# Altium schematic symbol library IC_TI.SCHLIB: 1162 symbols (part 7 of 8) (continued)
## TMS320F2812PGFA (continued)

## TMS320F28023DAT
designator U?
Integrated Circuit; Manufacturer_Name: Texas Instruments; Manufacturer_Part_Number: TMS320F28023DAT; Datasheet Link: http://www.ti.com/lit/gpn/tms320f28023
footprint TSSOP38_0.65
pins: 1 VDD_2, 2 VSS_2, 3 ~VREGENZ, 4 VDDIO, 5 GPIO2/EPWM2A, 6 GPIO3/EPWM2B, 7 GPIO4/EPWM3A, 8 GPIO5/EPWM3B/ECAP1, 9 GPIO6/EPWM4A/EPWMSYNCI/EPWMSYNCO, 10 GPIO7/EPWM4B/SCIRXDA, 11 VDD, 12 VSS, 13 GPIO12/~TZ1/SCITXDA, 14 GPIO28/SCIRXDA/SDAA/~TZ2, 15 GPIO29/SCITXDA/SCLA/~TZ3, 16 ~TRST, 17 ~XRS, 18 ADCINA6/AIO6, 19 ADCINA4/AIO4, 20 ADCINA2/COMP1A/AIO2, 21 ADCINA0/VREFHI, 22 VDDA, 23 VSSA/VREFLO, 24 ADCINB2/COMP1B/AIO10, 25 ADCINB4/AIO12, 26 ADCINB6/AIO14, 27 GPIO34, 28 GPIO35_(TDI), 29 GPIO36_(TMS), 30 GPIO37_(TDO), 31 GPIO38/XCLKIN_(TCK), 32 GPIO18/SPICLKA/SCITXDA/XCLKOUT, 33 GPIO19/XCLKIN/~SPISTEA/SCIRXDA/ECAP1, 34 GPIO17/SPISOMIA/~TZ3, 35 GPIO16/SPISIMOA/~TZ2, 36 GPIO1/EPWM1B/COMP1OUT, 37 GPIO0/EPWM1A, 38 TEST

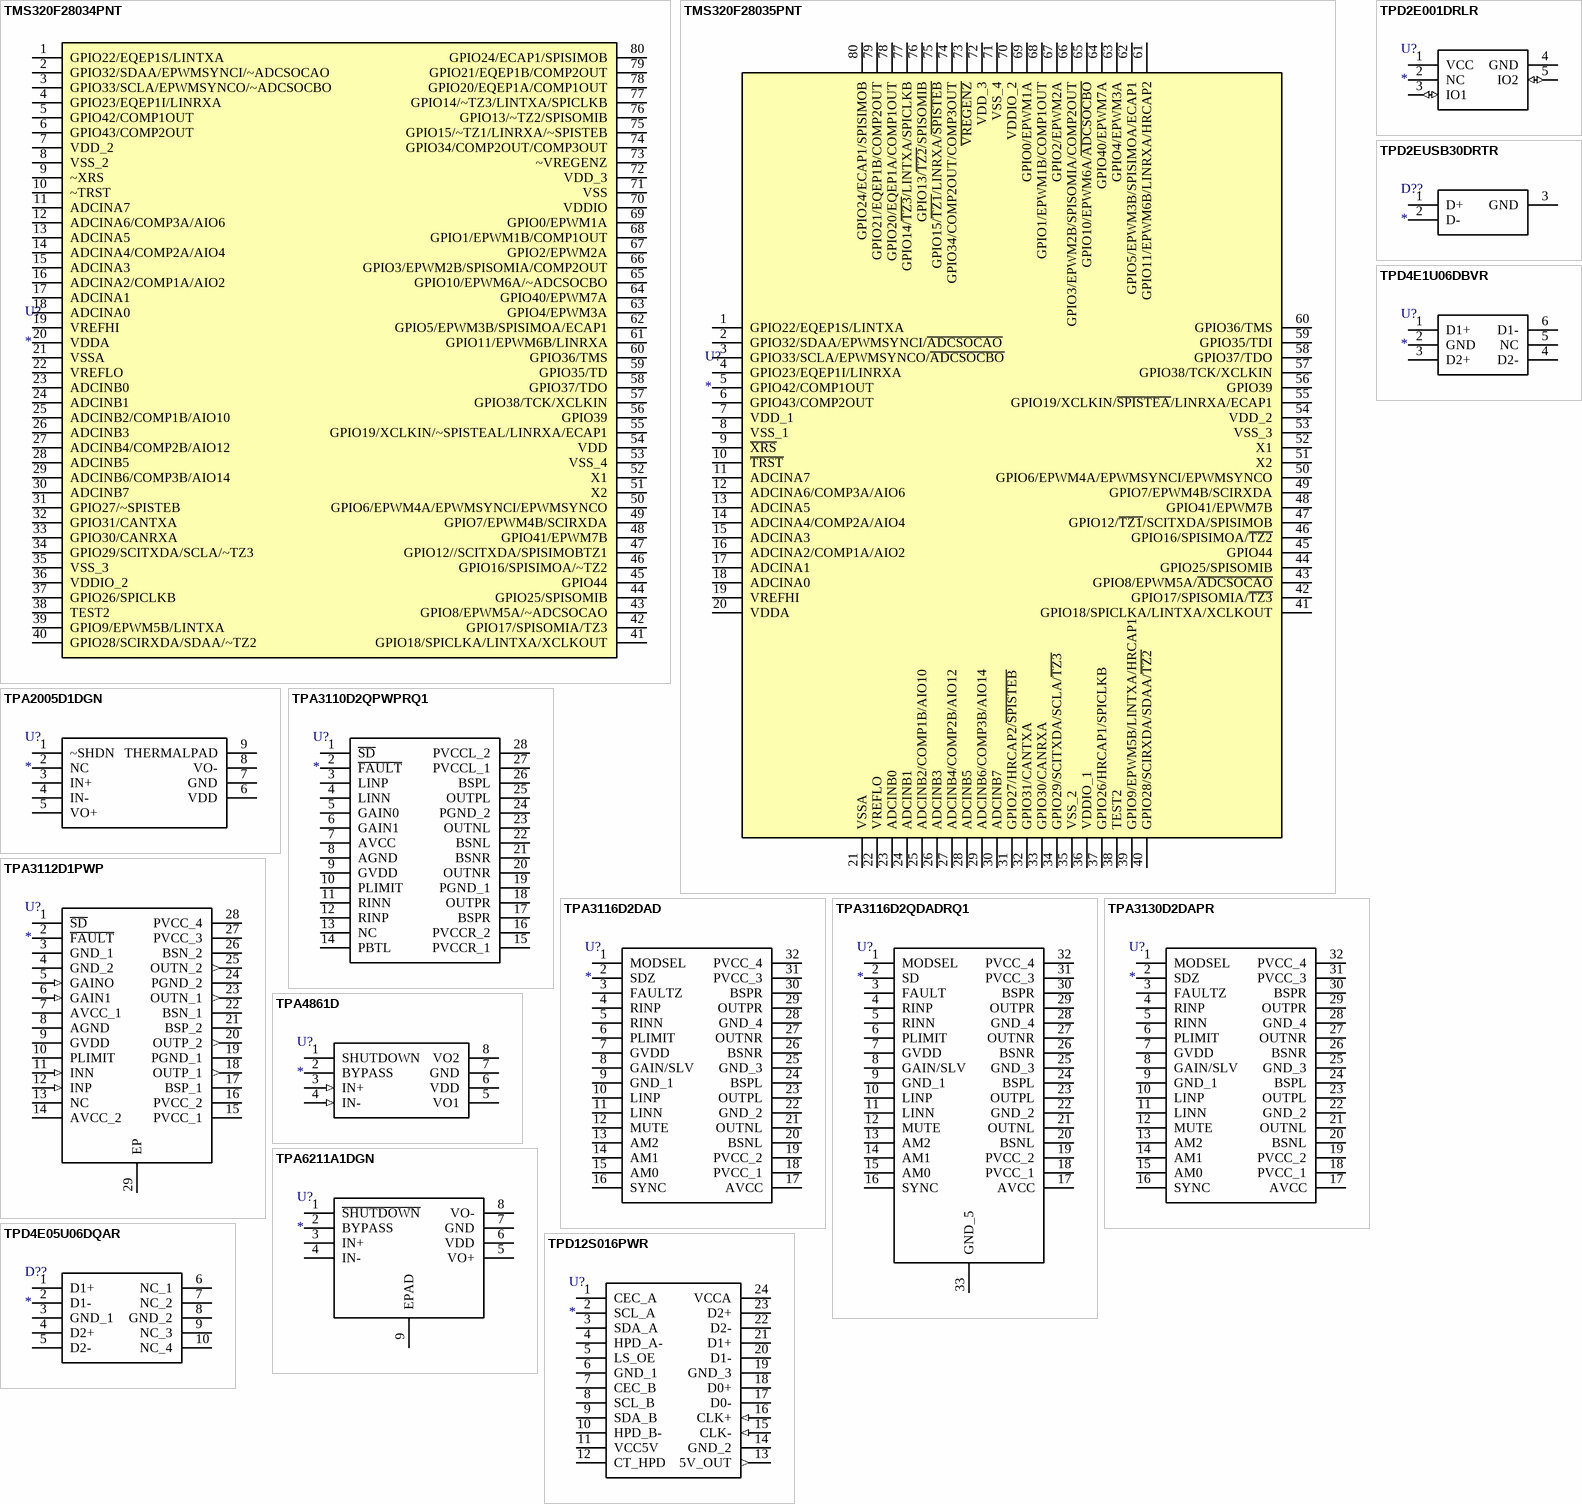
[diagram p29: symbols TMS320F28034PNT to TPD12S016PWR]

## TMS320F28034PNT
designator U?
Integrated Circuit; Manufacturer_Name: Texas Instruments; Manufacturer_Part_Number: TMS320F28034PNT; Mouser Part Number: 595-TMS320F28034PNT; Mouser Price/Stock: https://www.mouser.com/Search/Refine.aspx?Keyword=595-TMS320F28034PNT; RS Part Number: 8184844P; RS Price/Stock: http://uk.rs-online.com/web/p/products/8184844P
footprint LQFP80_0.5mm
pins: 1 GPIO22/EQEP1S/LINTXA, 2 GPIO32/SDAA/EPWMSYNCI/~ADCSOCAO, 3 GPIO33/SCLA/EPWMSYNCO/~ADCSOCBO, 4 GPIO23/EQEP1I/LINRXA, 5 GPIO42/COMP1OUT, 6 GPIO43/COMP2OUT, 7 VDD_2, 8 VSS_2, 9 ~XRS, 10 ~TRST, 11 ADCINA7, 12 ADCINA6/COMP3A/AIO6, 13 ADCINA5, 14 ADCINA4/COMP2A/AIO4, 15 ADCINA3, 16 ADCINA2/COMP1A/AIO2, 17 ADCINA1, 18 ADCINA0, 19 VREFHI, 20 VDDA, 21 VSSA, 22 VREFLO, 23 ADCINB0, 24 ADCINB1, 25 ADCINB2/COMP1B/AIO10, 26 ADCINB3, 27 ADCINB4/COMP2B/AIO12, 28 ADCINB5, 29 ADCINB6/COMP3B/AIO14, 30 ADCINB7, 31 GPIO27/~SPISTEB, 32 GPIO31/CANTXA, 33 GPIO30/CANRXA, 34 GPIO29/SCITXDA/SCLA/~TZ3, 35 VSS_3, 36 VDDIO_2, 37 GPIO26/SPICLKB, 38 TEST2, 39 GPIO9/EPWM5B/LINTXA, 40 GPIO28/SCIRXDA/SDAA/~TZ2, 41 GPIO18/SPICLKA/LINTXA/XCLKOUT, 42 GPIO17/SPISOMIA/TZ3, 43 GPIO8/EPWM5A/~ADCSOCAO, 44 GPIO25/SPISOMIB, 45 GPIO44, 46 GPIO16/SPISIMOA/~TZ2, 47 GPIO12//SCITXDA/SPISIMOBTZ1, 48 GPIO41/EPWM7B, 49 GPIO7/EPWM4B/SCIRXDA, 50 GPIO6/EPWM4A/EPWMSYNCI/EPWMSYNCO, 51 X2, 52 X1, 53 VSS_4, 54 VDD, 55 GPIO19/XCLKIN/~SPISTEAL/LINRXA/ECAP1, 56 GPIO39, 57 GPIO38/TCK/XCLKIN, 58 GPIO37/TDO, 59 GPIO35/TD, 60 GPIO36/TMS, 61 GPIO11/EPWM6B/LINRXA, 62 GPIO5/EPWM3B/SPISIMOA/ECAP1, 63 GPIO4/EPWM3A, 64 GPIO40/EPWM7A, 65 GPIO10/EPWM6A/~ADCSOCBO, 66 GPIO3/EPWM2B/SPISOMIA/COMP2OUT, 67 GPIO2/EPWM2A, 68 GPIO1/EPWM1B/COMP1OUT, 69 GPIO0/EPWM1A, 70 VDDIO, 71 VSS, 72 VDD_3, 73 ~VREGENZ, 74 GPIO34/COMP2OUT/COMP3OUT, 75 GPIO15/~TZ1/LINRXA/~SPISTEB, 76 GPIO13/~TZ2/SPISOMIB, 77 GPIO14/~TZ3/LINTXA/SPICLKB, 78 GPIO20/EQEP1A/COMP1OUT, 79 GPIO21/EQEP1B/COMP2OUT, 80 GPIO24/ECAP1/SPISIMOB

## TMS320F28035PNT
designator U?
Integrated Circuit; Manufacturer_Name: Texas Instruments; Manufacturer_Part_Number: TMS320F28035PNT; Datasheet Link: http://www.ti.com/lit/ds/symlink/tms320f28035.pdf; Height: 1.6mm; Mouser Part Number: 595-TMS320F28035PNT; Mouser Price/Stock: https://www.mouser.com/Search/Refine.aspx?Keyword=595-TMS320F28035PNT; RS Part Number: 6987013P; RS Price/Stock: http://uk.rs-online.com/web/p/products/6987013P
footprint LQFP80_0.5mm
pins: 1 GPIO22/EQEP1S/LINTXA, 2 GPIO32/SDAA/EPWMSYNCI/~{ADCSOCAO}, 3 GPIO33/SCLA/EPWMSYNCO/~{ADCSOCBO}, 4 GPIO23/EQEP1I/LINRXA, 5 GPIO42/COMP1OUT, 6 GPIO43/COMP2OUT, 7 VDD_1, 8 VSS_1, 9 ~{XRS}, 10 ~{TRST}, 11 ADCINA7, 12 ADCINA6/COMP3A/AIO6, 13 ADCINA5, 14 ADCINA4/COMP2A/AIO4, 15 ADCINA3, 16 ADCINA2/COMP1A/AIO2, 17 ADCINA1, 18 ADCINA0, 19 VREFHI, 20 VDDA, 21 VSSA, 22 VREFLO, 23 ADCINB0, 24 ADCINB1, 25 ADCINB2/COMP1B/AIO10, 26 ADCINB3, 27 ADCINB4/COMP2B/AIO12, 28 ADCINB5, 29 ADCINB6/COMP3B/AIO14, 30 ADCINB7, 31 GPIO27/HRCAP2/~{SPISTEB}, 32 GPIO31/CANTXA, 33 GPIO30/CANRXA, 34 GPIO29/SCITXDA/SCLA/~{TZ3}, 35 VSS_2, 36 VDDIO_1, 37 GPIO26/HRCAP1/SPICLKB, 38 TEST2, 39 GPIO9/EPWM5B/LINTXA/HRCAP1, 40 GPIO28/SCIRXDA/SDAA/~{TZ2}, 41 GPIO18/SPICLKA/LINTXA/XCLKOUT, 42 GPIO17/SPISOMIA/~{TZ3}, 43 GPIO8/EPWM5A/~{ADCSOCAO}, 44 GPIO25/SPISOMIB, 45 GPIO44, 46 GPIO16/SPISIMOA/~{TZ2}, 47 GPIO12/~{TZ1}/SCITXDA/SPISIMOB, 48 GPIO41/EPWM7B, 49 GPIO7/EPWM4B/SCIRXDA, 50 GPIO6/EPWM4A/EPWMSYNCI/EPWMSYNCO, 51 X2, 52 X1, 53 VSS_3, 54 VDD_2, 55 GPIO19/XCLKIN/~{SPISTEA}/LINRXA/ECAP1, 56 GPIO39, 57 GPIO38/TCK/XCLKIN, 58 GPIO37/TDO, 59 GPIO35/TDI, 60 GPIO36/TMS, 61 GPIO11/EPWM6B/LINRXA/HRCAP2, 62 GPIO5/EPWM3B/SPISIMOA/ECAP1, 63 GPIO4/EPWM3A, 64 GPIO40/EPWM7A, 65 GPIO10/EPWM6A/~{ADCSOCBO}, 66 GPIO3/EPWM2B/SPISOMIA/COMP2OUT, 67 GPIO2/EPWM2A, 68 GPIO1/EPWM1B/COMP1OUT, 69 GPIO0/EPWM1A, 70 VDDIO_2, 71 VSS_4, 72 VDD_3, 73 ~{VREGENZ}, 74 GPIO34/COMP2OUT/COMP3OUT, 75 GPIO15/~{TZ1}/LINRXA/~{SPISTEB}, 76 GPIO13/~{TZ2}/SPISOMIB, 77 GPIO14/~{TZ3}/LINTXA/SPICLKB, 78 GPIO20/EQEP1A/COMP1OUT, 79 GPIO21/EQEP1B/COMP2OUT, 80 GPIO24/ECAP1/SPISIMOB

## TPA2005D1DGN
designator U?
Integrated Circuit; Manufacturer_Name: Texas Instruments; Manufacturer_Part_Number: TPA2005D1DGN; Datasheet Link: http://www.ti.com/lit/gpn/tpa2005d1; Mouser Part Number: 595-TPA2005D1DGN; Mouser Price/Stock: https://www.mouser.com/Search/Refine.aspx?Keyword=595-TPA2005D1DGN; RS Part Number: 1625314; RS Price/Stock: http://uk.rs-online.com/web/p/products/1625314
footprint VSSOP8_0.65-PAD
pins: 1 ~SHDN, 2 NC, 3 IN+, 4 IN-, 5 VO+, 6 VDD, 7 GND, 8 VO-, 9 THERMALPAD

## TPA3110D2QPWPRQ1
designator U?
Integrated Circuit; Manufacturer_Name: Texas Instruments; Manufacturer_Part_Number: TPA3110D2QPWPRQ1; Datasheet Link: http://www.ti.com/lit/gpn/tpa3110d2-q1; Height: 1.2mm; Mouser Part Number: 595-TPA3110D2QPWPRQ1; Mouser Price/Stock: https://www.mouser.com/Search/Refine.aspx?Keyword=595-TPA3110D2QPWPRQ1
footprint TSSOP28_0.65
pins: 1 ~{SD}, 2 ~{FAULT}, 3 LINP, 4 LINN, 5 GAIN0, 6 GAIN1, 7 AVCC, 8 AGND, 9 GVDD, 10 PLIMIT, 11 RINN, 12 RINP, 13 NC, 14 PBTL, 15 PVCCR_1, 16 PVCCR_2, 17 BSPR, 18 OUTPR, 19 PGND_1, 20 OUTNR, 21 BSNR, 22 BSNL, 23 OUTNL, 24 PGND_2, 25 OUTPL, 26 BSPL, 27 PVCCL_1, 28 PVCCL_2

## TPA3112D1PWP
designator U?
Integrated Circuit; Manufacturer_Name: Texas Instruments; Manufacturer_Part_Number: TPA3112D1PWP; Datasheet Link: http://docs-emea.rs-online.com/webdocs/12f7/0900766b812f7a8f.pdf; Height: 1.2mm; Mouser Part Number: 595-TPA3112D1PWP; Mouser Price/Stock: https://www.mouser.com/Search/Refine.aspx?Keyword=595-TPA3112D1PWP; RS Part Number: 8124227P; RS Price/Stock: http://uk.rs-online.com/web/p/products/8124227P
footprint TSSOP28_0.65-PAD
pins: 1 ~{SD}, 2 ~{FAULT}, 3 GND_1 (power), 4 GND_2 (power), 5 GAINO (in), 6 GAIN1 (in), 7 AVCC_1 (power), 8 AGND (power), 9 GVDD (power), 10 PLIMIT, 11 INN (in), 12 INP (in), 13 NC, 14 AVCC_2 (power), 15 PVCC_1 (power), 16 PVCC_2 (power), 17 BSP_1, 18 OUTP_1 (out), 19 PGND_1 (power), 20 OUTP_2 (out), 21 BSP_2, 22 BSN_1, 23 OUTN_1 (out), 24 PGND_2 (power), 25 OUTN_2 (out), 26 BSN_2, 27 PVCC_3 (power), 28 PVCC_4 (power), 29 EP

## TPA3116D2DAD
designator U?
Integrated Circuit; Manufacturer_Name: Texas Instruments; Manufacturer_Part_Number: TPA3116D2DAD; Datasheet Link: http://www.ti.com/lit/ds/symlink/tpa3116d2.pdf; Height: 1.2mm; Mouser Part Number: 595-TPA3116D2DAD; Mouser Price/Stock: https://www.mouser.com/Search/Refine.aspx?Keyword=595-TPA3116D2DAD; RS Part Number: 1627861; RS Price/Stock: http://uk.rs-online.com/web/p/products/1627861
footprint TSSOP32_0.65
pins: 1 MODSEL, 2 SDZ, 3 FAULTZ, 4 RINP, 5 RINN, 6 PLIMIT, 7 GVDD, 8 GAIN/SLV, 9 GND_1, 10 LINP, 11 LINN, 12 MUTE, 13 AM2, 14 AM1, 15 AM0, 16 SYNC, 17 AVCC, 18 PVCC_1, 19 PVCC_2, 20 BSNL, 21 OUTNL, 22 GND_2, 23 OUTPL, 24 BSPL, 25 GND_3, 26 BSNR, 27 OUTNR, 28 GND_4, 29 OUTPR, 30 BSPR, 31 PVCC_3, 32 PVCC_4

## TPA3116D2QDADRQ1
designator U?
Integrated Circuit; Manufacturer_Name: Texas Instruments; Manufacturer_Part_Number: TPA3116D2QDADRQ1; Datasheet Link: http://www.ti.com/lit/gpn/tpa3116d2-q1; Height: 1.2mm; Mouser Part Number: 595-TPA3116D2QDADRQ1; Mouser Price/Stock: https://www.mouser.com/Search/Refine.aspx?Keyword=595-TPA3116D2QDADRQ1
footprint TSSOP32_0.65-PAD
pins: 1 MODSEL, 2 SD, 3 FAULT, 4 RINP, 5 RINN, 6 PLIMIT, 7 GVDD, 8 GAIN/SLV, 9 GND_1, 10 LINP, 11 LINN, 12 MUTE, 13 AM2, 14 AM1, 15 AM0, 16 SYNC, 17 AVCC, 18 PVCC_1, 19 PVCC_2, 20 BSNL, 21 OUTNL, 22 GND_2, 23 OUTPL, 24 BSPL, 25 GND_3, 26 BSNR, 27 OUTNR, 28 GND_4, 29 OUTPR, 30 BSPR, 31 PVCC_3, 32 PVCC_4, 33 GND_5

## TPA3130D2DAPR
designator U?
Integrated Circuit; Manufacturer_Name: Texas Instruments; Manufacturer_Part_Number: TPA3130D2DAPR; Datasheet Link: http://www.ti.com/lit/ds/symlink/tpa3130d2.pdf; Height: 1.2mm; Mouser Part Number: 595-TPA3130D2DAPR; Mouser Price/Stock: https://www.mouser.com/Search/Refine.aspx?Keyword=595-TPA3130D2DAPR
footprint TSSOP32_0.65
pins: 1 MODSEL, 2 SDZ, 3 FAULTZ, 4 RINP, 5 RINN, 6 PLIMIT, 7 GVDD, 8 GAIN/SLV, 9 GND_1, 10 LINP, 11 LINN, 12 MUTE, 13 AM2, 14 AM1, 15 AM0, 16 SYNC, 17 AVCC, 18 PVCC_1, 19 PVCC_2, 20 BSNL, 21 OUTNL, 22 GND_2, 23 OUTPL, 24 BSPL, 25 GND_3, 26 BSNR, 27 OUTNR, 28 GND_4, 29 OUTPR, 30 BSPR, 31 PVCC_3, 32 PVCC_4

## TPA4861D
designator U?
Integrated Circuit; Manufacturer_Name: Texas Instruments; Manufacturer_Part_Number: TPA4861D; Datasheet Link: http://www.ti.com/lit/ds/symlink/tpa4861.pdf; Height: 1.75mm; Mouser Part Number: 595-TPA4861D; Mouser Price/Stock: https://www.mouser.com/Search/Refine.aspx?Keyword=595-TPA4861D; RS Part Number: 1456524; RS Price/Stock: http://uk.rs-online.com/web/p/products/1456524
footprint SOIC8_1.27 (SOP, 8-Leads, Pitch 1.27mm)
pins: 1 SHUTDOWN, 2 BYPASS, 3 IN+ (in), 4 IN- (in), 5 VO1, 6 VDD (power), 7 GND (power), 8 VO2

## TPA6211A1DGN
designator U?
Integrated Circuit; Manufacturer_Name: Texas Instruments; Manufacturer_Part_Number: TPA6211A1DGN; Datasheet Link: http://www.ti.com/lit/gpn/tpa6211a1; Height: 1.1mm; Mouser Part Number: 595-TPA6211A1DGN; Mouser Price/Stock: https://www.mouser.com/Search/Refine.aspx?Keyword=595-TPA6211A1DGN; RS Part Number: 1625323; RS Price/Stock: http://uk.rs-online.com/web/p/products/1625323
footprint VSSOP8_0.65-PAD
pins: 1 ~{SHUTDOWN}, 2 BYPASS, 3 IN+, 4 IN-, 5 VO+, 6 VDD, 7 GND, 8 VO-, 9 EPAD

## TPD2E001DRLR
designator U?
Integrated Circuit; Manufacturer_Name: Texas Instruments; Manufacturer_Part_Number: TPD2E001DRLR; Datasheet Link: http://www.ti.com/lit/ds/symlink/tpd2e001.pdf; Height: 0.6mm; Mouser Part Number: 595-TPD2E001DRLR; Mouser Price/Stock: https://www.mouser.com/Search/Refine.aspx?Keyword=595-TPD2E001DRLR; RS Part Number: 7099050; RS Price/Stock: http://uk.rs-online.com/web/p/products/7099050
footprint SOT553
pins: 1 VCC (power), 2 NC, 3 IO1 (io), 4 GND (power), 5 IO2 (io)

## TPD2EUSB30DRTR
designator D??
Diode; Manufacturer_Name: Texas Instruments; Manufacturer_Part_Number: TPD2EUSB30DRTR; Datasheet Link: http://docs-emea.rs-online.com/webdocs/1520/0900766b81520865.pdf; Height: 0.5mm; Mouser Part Number: 595-TPD2EUSB30DRTR; Mouser Price/Stock: https://www.mouser.com/Search/Refine.aspx?Keyword=595-TPD2EUSB30DRTR; RS Part Number: 7968357P; RS Price/Stock: http://uk.rs-online.com/web/p/products/7968357P
footprint SOT723
pins: 1 D+, 2 D-, 3 GND

## TPD4E1U06DBVR
designator U?
Integrated Circuit; Manufacturer_Name: Texas Instruments; Manufacturer_Part_Number: TPD4E1U06DBVR; Datasheet Link: http://www.ti.com/lit/ds/symlink/tpd4e1u06.pdf; Height: 1.45mm; Mouser Part Number: 595-TPD4E1U06DBVR; Mouser Price/Stock: https://www.mouser.com/Search/Refine.aspx?Keyword=595-TPD4E1U06DBVR; RS Part Number: 8255334P; RS Price/Stock: http://uk.rs-online.com/web/p/products/8255334P
footprint SOT23-6
pins: 1 D1+, 2 GND (power), 3 D2+, 4 D2-, 5 NC, 6 D1-

## TPD4E05U06DQAR
designator D??
Diode; Manufacturer_Name: Texas Instruments; Manufacturer_Part_Number: TPD4E05U06DQAR; Datasheet Link: http://www.ti.com/lit/gpn/tpd4e05u06; Mouser Part Number: 595-TPD4E05U06DQAR; Mouser Price/Stock: https://www.mouser.com/Search/Refine.aspx?Keyword=595-TPD4E05U06DQAR
footprint SON10_0.5-PAD(1X2.5)
pins: 1 D1+, 2 D1-, 3 GND_1, 4 D2+, 5 D2-, 6 NC_1, 7 NC_2, 8 GND_2, 9 NC_3, 10 NC_4

## TPD12S016PWR
designator U?
Integrated Circuit; Manufacturer_Name: Texas Instruments; Manufacturer_Part_Number: TPD12S016PWR; Datasheet Link: http://www.ti.com/lit/ds/symlink/tpd12s016.pdf; Height: 1.2mm; Mouser Part Number: 595-TPD12S016PWR; Mouser Price/Stock: https://www.mouser.com/Search/Refine.aspx?Keyword=595-TPD12S016PWR; RS Part Number: 1627865; RS Price/Stock: http://uk.rs-online.com/web/p/products/1627865
footprint TSSOP24_0.65 (TSOP, 24-Leads, Body 7.80x4.40mm, Pitch 0.65mm, Thermal Pad 5.16x2.40mm, IPC Low Density)
pins: 1 CEC_A, 2 SCL_A, 3 SDA_A, 4 HPD_A-, 5 LS_OE, 6 GND_1 (power), 7 CEC_B, 8 SCL_B, 9 SDA_B, 10 HPD_B-, 11 VCC5V (power), 12 CT_HPD, 13 5V_OUT (out), 14 GND_2 (power), 15 CLK- (in), 16 CLK+ (in), 17 D0-, 18 D0+, 19 GND_3 (power), 20 D1-, 21 D1+, 22 D2-, 23 D2+, 24 VCCA (power)

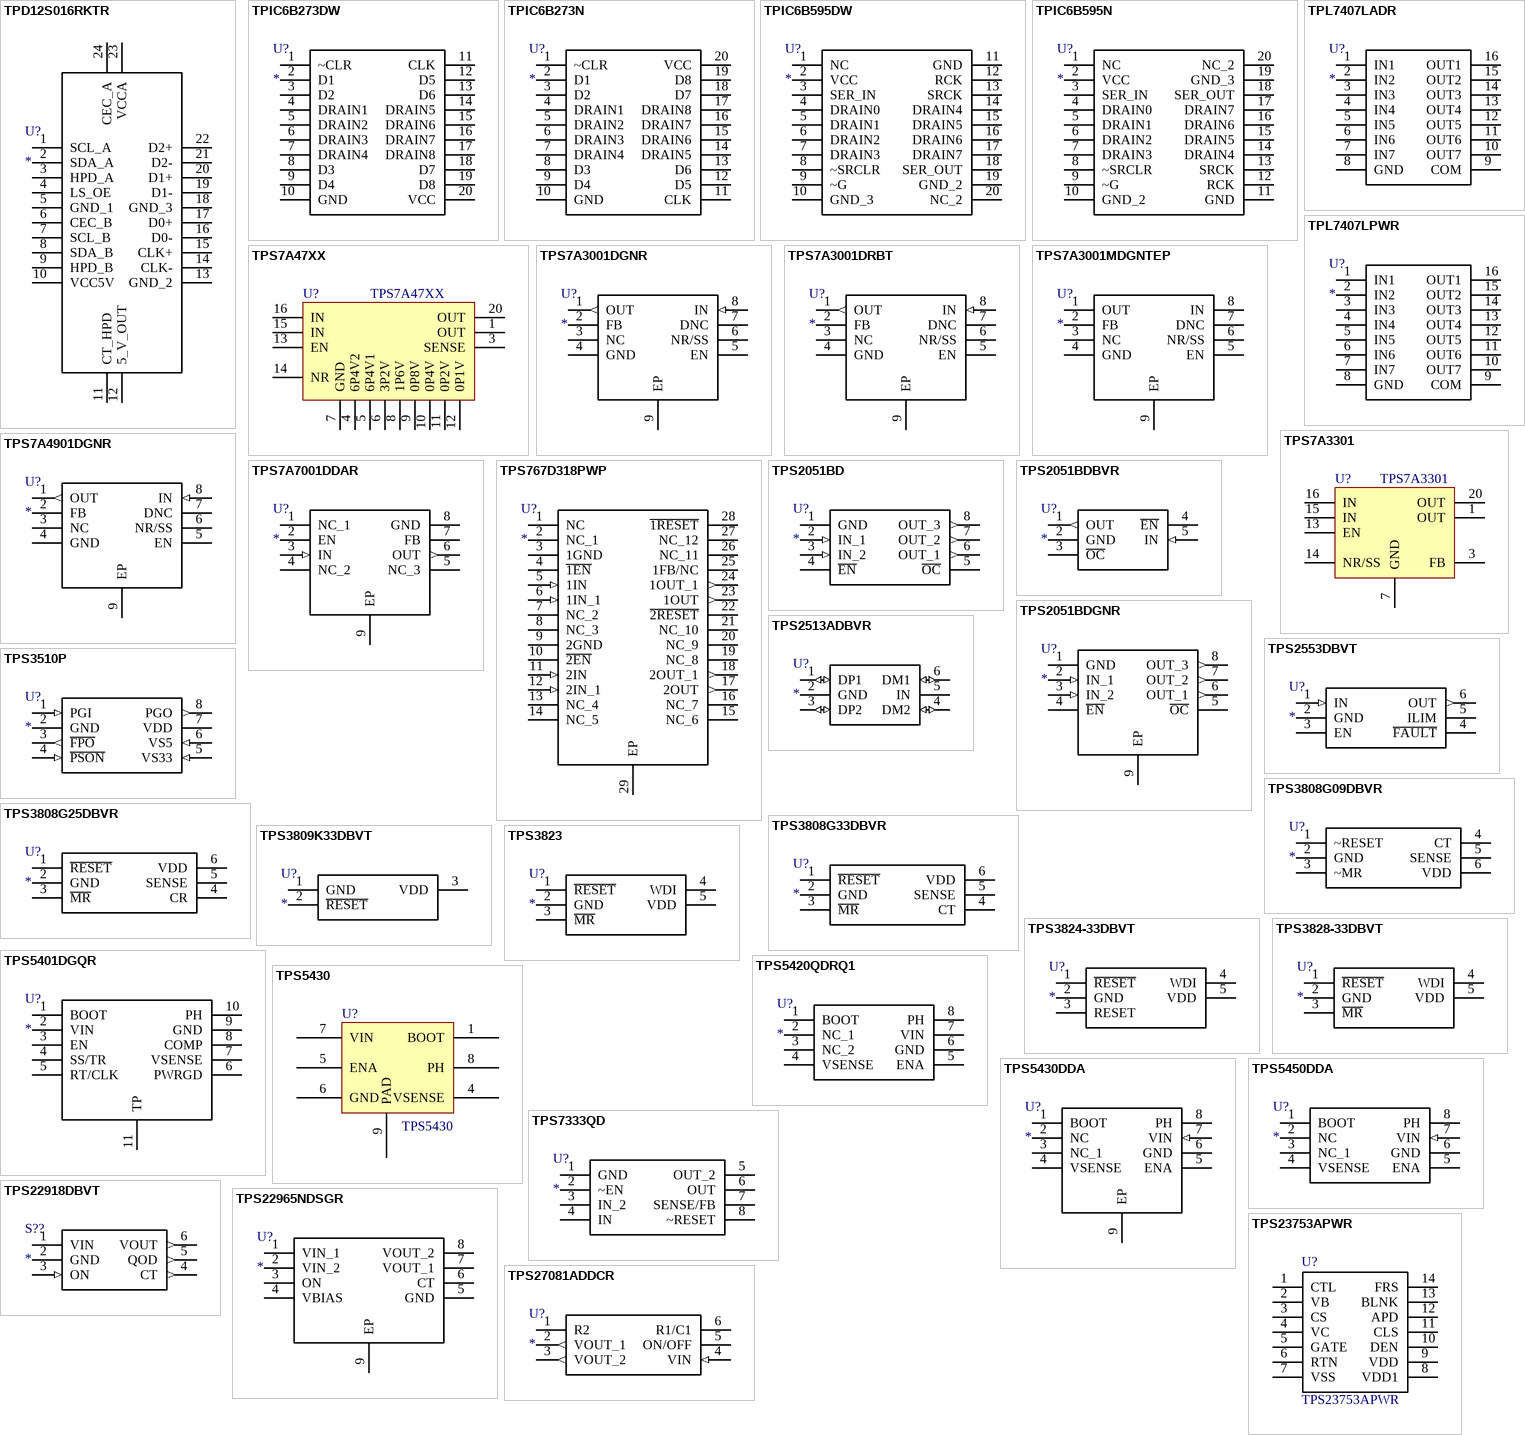
[diagram p30: symbols TPD12S016RKTR to TPS27081ADDCR]

## TPD12S016RKTR
designator U?
Integrated Circuit; Manufacturer_Name: Texas Instruments; Manufacturer_Part_Number: TPD12S016RKTR; Datasheet Link: http://www.ti.com/lit/gpn/tpd12s016; Height: 0.55mm; Mouser Part Number: 595-TPD12S016RKTR; Mouser Price/Stock: https://www.mouser.com/Search/Refine.aspx?Keyword=595-TPD12S016RKTR
footprint QFN24_0.4(2X4)
pins: 1 SCL_A, 2 SDA_A, 3 HPD_A, 4 LS_OE, 5 GND_1, 6 CEC_B, 7 SCL_B, 8 SDA_B, 9 HPD_B, 10 VCC5V, 11 CT_HPD, 12 5_V_OUT, 13 GND_2, 14 CLK-, 15 CLK+, 16 D0-, 17 D0+, 18 GND_3, 19 D1-, 20 D1+, 21 D2-, 22 D2+, 23 VCCA, 24 CEC_A

## TPIC6B273DW
designator U?
Integrated Circuit; Manufacturer_Name: Texas Instruments; Manufacturer_Part_Number: TPIC6B273DW; Mouser Part Number: 595-TPIC6B273DW; Mouser Price/Stock: http://www.mouser.com/Search/ProductDetail.aspx?qs=3FVjRv9mUZ%252bR5OlcM2DI0w%3d%3d; RS Part Number: 1785509; RS Price/Stock: http://uk.rs-online.com/web/p/products/1785509
footprint SOIC20W_1.27
pins: 1 ~CLR, 2 D1, 3 D2, 4 DRAIN1, 5 DRAIN2, 6 DRAIN3, 7 DRAIN4, 8 D3, 9 D4, 10 GND, 11 CLK, 12 D5, 13 D6, 14 DRAIN5, 15 DRAIN6, 16 DRAIN7, 17 DRAIN8, 18 D7, 19 D8, 20 VCC

## TPIC6B273N
designator U?
Integrated Circuit; Manufacturer_Name: Texas Instruments; Manufacturer_Part_Number: TPIC6B273N; Datasheet Link: http://www.ti.com/lit/gpn/tpic6b273; Mouser Part Number: 595-TPIC6B273N; Mouser Price/Stock: http://www.mouser.com/Search/ProductDetail.aspx?qs=HE9hdJajmepGd4zK1YzwsQ%3d%3d; RS Part Number: 1625327; RS Price/Stock: http://uk.rs-online.com/web/p/products/1625327
footprint DIP20
pins: 1 ~CLR, 2 D1, 3 D2, 4 DRAIN1, 5 DRAIN2, 6 DRAIN3, 7 DRAIN4, 8 D3, 9 D4, 10 GND, 11 CLK, 12 D5, 13 D6, 14 DRAIN5, 15 DRAIN6, 16 DRAIN7, 17 DRAIN8, 18 D7, 19 D8, 20 VCC

## TPIC6B595DW
designator U?
Integrated Circuit; Manufacturer_Name: Texas Instruments; Manufacturer_Part_Number: TPIC6B595DW; Datasheet Link: http://www.ti.com/lit/gpn/tpic6b595; Mouser Part Number: 595-TPIC6B595DW; Mouser Price/Stock: https://www.mouser.com/Search/Refine.aspx?Keyword=595-TPIC6B595DW; RS Part Number: 0528139; RS Price/Stock: http://uk.rs-online.com/web/p/products/0528139
footprint SOIC20W_1.27
pins: 1 NC, 2 VCC, 3 SER_IN, 4 DRAIN0, 5 DRAIN1, 6 DRAIN2, 7 DRAIN3, 8 ~SRCLR, 9 ~G, 10 GND_3, 11 GND, 12 RCK, 13 SRCK, 14 DRAIN4, 15 DRAIN5, 16 DRAIN6, 17 DRAIN7, 18 SER_OUT, 19 GND_2, 20 NC_2

## TPIC6B595N
designator U?
Integrated Circuit; Manufacturer_Name: Texas Instruments; Manufacturer_Part_Number: TPIC6B595N; Datasheet Link: http://www.ti.com/lit/gpn/tpic6b595; Mouser Part Number: 595-TPIC6B595N; Mouser Price/Stock: https://www.mouser.com/Search/Refine.aspx?Keyword=595-TPIC6B595N; RS Part Number: 0528145; RS Price/Stock: http://uk.rs-online.com/web/p/products/0528145
footprint DIP20
pins: 1 NC, 2 VCC, 3 SER_IN, 4 DRAIN0, 5 DRAIN1, 6 DRAIN2, 7 DRAIN3, 8 ~SRCLR, 9 ~G, 10 GND_2, 11 GND, 12 RCK, 13 SRCK, 14 DRAIN4, 15 DRAIN5, 16 DRAIN6, 17 DRAIN7, 18 SER_OUT, 19 GND_3, 20 NC_2

## TPL7407LADR
designator U?
Integrated Circuit; Manufacturer_Name: Texas Instruments; Manufacturer_Part_Number: TPL7407LADR; Datasheet Link: http://www.ti.com/lit/gpn/tpl7407la; Height: 1.75mm; Mouser Part Number: 595-TPL7407LADR; Mouser Price/Stock: https://www.mouser.com/Search/Refine.aspx?Keyword=595-TPL7407LADR
footprint SOIC16_1.27
pins: 1 IN1, 2 IN2, 3 IN3, 4 IN4, 5 IN5, 6 IN6, 7 IN7, 8 GND, 9 COM, 10 OUT7, 11 OUT6, 12 OUT5, 13 OUT4, 14 OUT3, 15 OUT2, 16 OUT1